# Altium footprint library DrPCB.PcbLib: 910 footprints (part 11 of 57)
Each footprint in its own frame and in the unit in brackets; x right, y up, seen from the top. Pads: shape width x height; smd on the part's side, far side on the other; paste and mask are expansions set on the pad; w line width, h text height; cw(c..) or ccw(c..) is an arc to the next point about the centre after c.
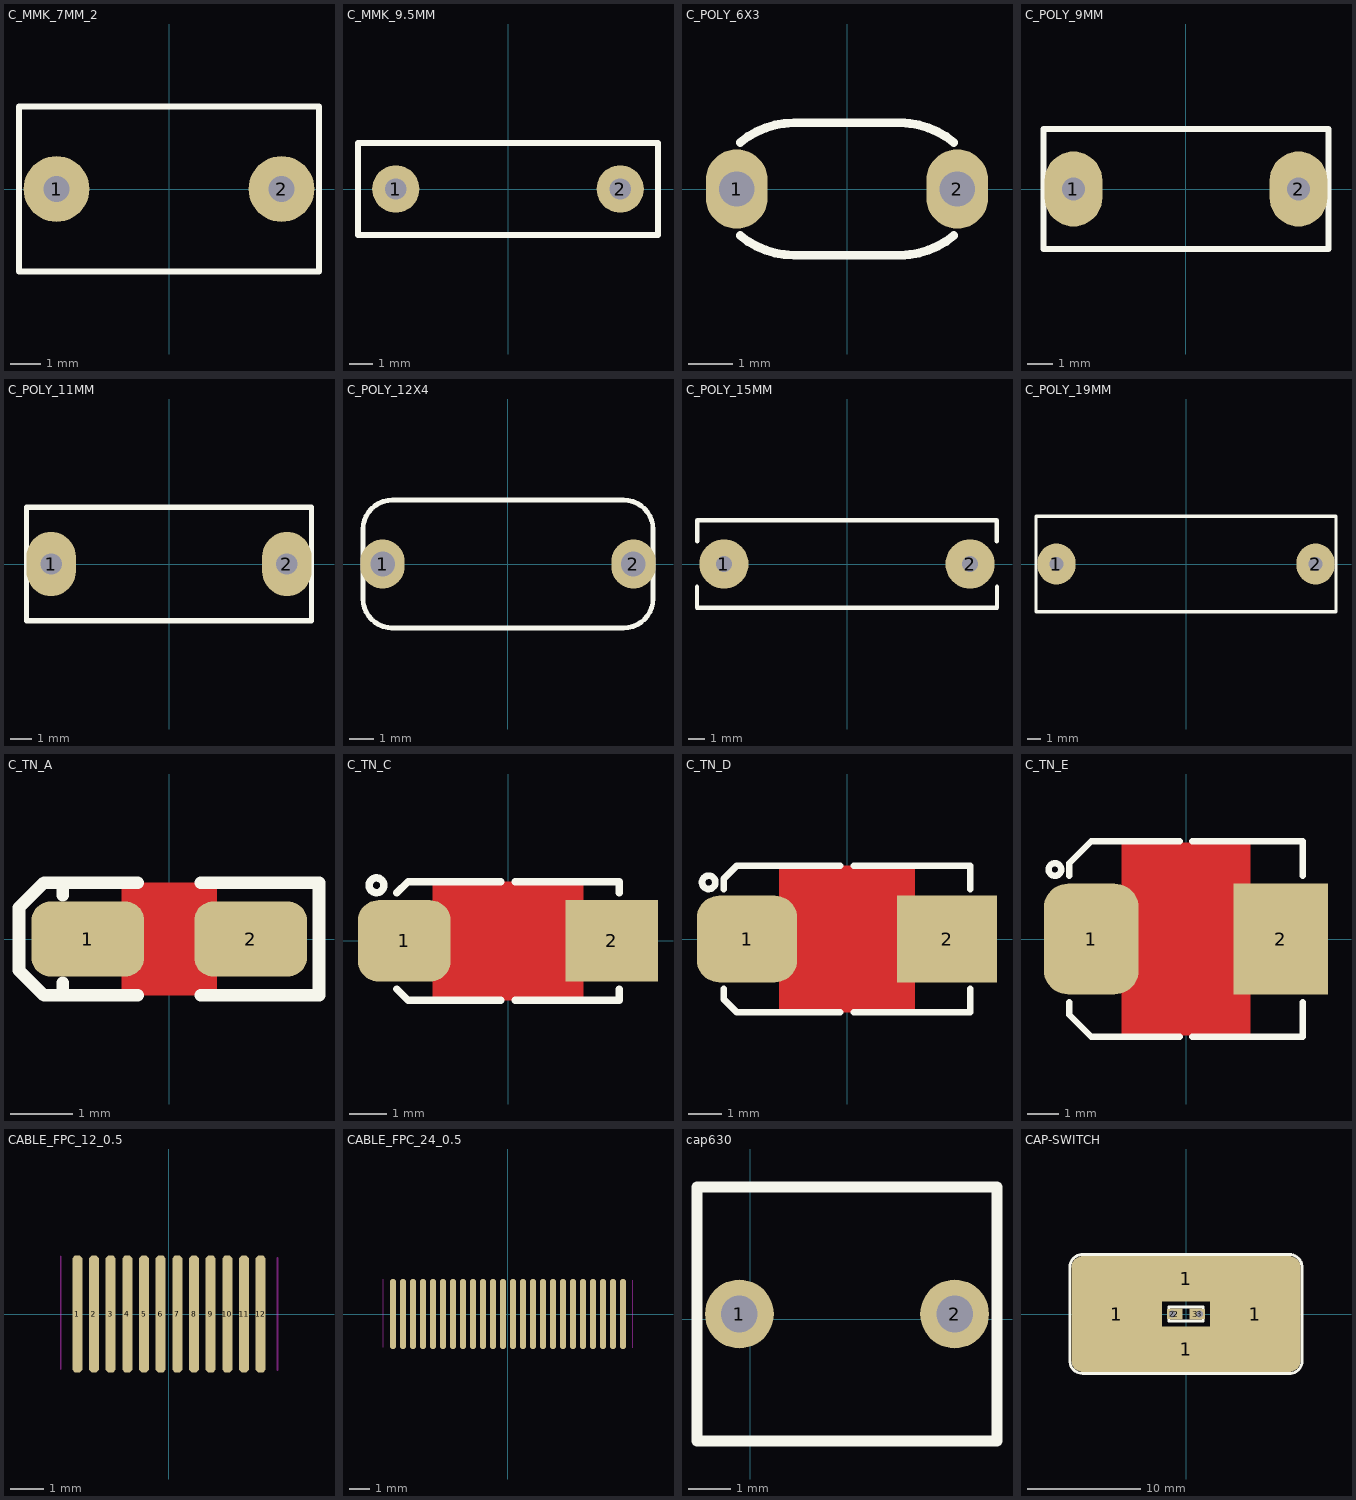
[diagram p10: the footprints below, top view; thin cyan lines are the x and y axes]

## C_MMK_7MM_2 [mm]
pads (2):
  round 2.2 hole 0.85: 1(-3.75,0) 2(3.75,0)
Top Overlay:
  lines w0.2: -5,-2.75 5,-2.75 5,2.75 -5,2.75 -5,-2.75
3D body: height 11.5, standoff 0, extent -5.004,-2.743 4.991,2.718

## C_MMK_9.5MM [mm]
pads (2):
  round 2 hole 0.9: 1(-4.75,0) 2(4.75,0)
Top Overlay:
  lines w0.254: -6.35,-1.95 6.35,-1.95 6.35,1.95 -6.35,1.95 -6.35,-1.95

## C_POLY_6X3 [mm] "CAP, POLYESTER, 5.8X3.5mm pitch: 5.0mm"
pads (2):
  oval 1.4x1.8 hole 0.8: 1(-2.5,0) 2(2.5,0)
Top Overlay:
  lines w0.2: -2.421,-1.055 ccw(c-1.2,0.4) -1.2,-1.5 1.3,-1.5 ; -2.421,1.055 cw(c-1.2,-0.4) -1.2,1.5 1.3,1.5 ; 1.2,-1.5 ccw(c1.2,0.4) 2.421,-1.055 ; 1.2,1.5 cw(c1.2,-0.4) 2.421,1.055
3D body "CAP 6mm Adasi.STEP": height 8.5, standoff -25.12, extent -2.95,-1.9 3.05,1.9

## C_POLY_9MM [mm]
pads (2):
  oval 2.3x3 hole 0.9: 1(-4.5,0) 2(4.5,0)
Top Overlay:
  lines w0.254: -5.7,-2.4 -5.7,2.4 5.7,2.4 5.7,-2.4 -5.7,-2.4

## C_POLY_11MM [mm]
pads (2):
  oval 2.3x3 hole 1: 1(-5.5,0) 2(5.5,0)
Top Overlay:
  lines w0.254: 6.629,-2.65 -6.65,-2.65 -6.65,2.65 6.629,2.65 ; 6.65,-2.65 6.65,2.65
3D body "User Library-Capacitor MKT_B32591C3104 (Pitch 10mm).step": height 12, standoff -6.5, extent -6.51,-2.5 6.49,2.5

## C_POLY_12X4 [mm] "CAP, POLYESTER, 12.5X4.5X9.0 pitch: 10mm"
height 9
pads (2):
  oval 1.8x2 hole 1: 1(-5.1,0) 2(5.1,0)
Top Overlay:
  lines w0.2: -4.734,-2.6 4.702,-2.6 ccw(c4.702,-1.4) 5.902,-1.4 ; -4.7,-2.6 cw(c-4.7,-1.4) -5.9,-1.4 -5.9,1.4 cw(c-4.7,1.4) -4.7,2.6 4.702,2.6 cw(c4.702,1.4) 5.902,1.4 ; 5.9,-1.4 5.9,1.4
3D body "User Library-Capacitor MKT_B32591C3104 (Pitch 10mm).step": height 12.5, standoff -6, extent -6.5,-2.5 6.5,2.5

## C_POLY_15MM [mm]
pads (2):
  round 3 hole 1: 1(-7.5,0) 2(7.5,0)
Top Overlay:
  lines w0.254: -9.144,-1.384 -9.144,-2.667 9.144,-2.667 9.144,-1.384 ; -9.131,1.384 -9.131,2.667 9.131,2.667 9.131,1.384
3D body "User Library-CPLP15mm.step": height 11, standoff -2.6, extent -9,-2.5 9,2.5

## C_POLY_19MM [mm]
pads (2):
  oval 2.8x3 hole 1: 1(-9.5,0) 2(9.5,0)
Top Overlay:
  lines w0.254: -11,-3.5 -11,3.5 11,3.5 11,-3.5 -11,-3.5
3D body: height 14, standoff 0, extent -10.998,-3.505 10.998,3.48

## C_TN_A [mm] "CAPACITOR, TAN A, 1206P, 3.2x1.6mm"
height 1.8
pads (2):
  rrect50% 1.8x1.2 smd mask+0.075: 1(-1.3,0) 2(1.3,0)
Top Layer:
  pour cut-out: -0.762,0.9 0.762,0.9 0.762,-0.9 -0.762,-0.9
Top Overlay:
  lines w0.2: -1.7,-0.7 -1.7,-0.9 ; -1.7,0.7 -1.7,0.9 ; -0.5,-0.9 -1.7,-0.9 ; -0.5,0.9 -1.7,0.9 ; 0.5,-0.9 2.392,-0.9 2.392,0.9 ; 0.5,0.9 2.362,0.9 ; -1.7,-0.9 -2,-0.9 -2.4,-0.5 -2.4,0.5 -2,0.9 -1.7,0.9
3D body "User Library-CAP_TANT_3216-18_A_case-1.step": height 1.7, standoff 0, extent -1.7,-0.9 1.7,0.9

## C_TN_C [mm] "CAPACITOR, TAN C, TAN F, TAN U, TAN L, 6032P, 6.0X3.2mm"
height 2.8
pads (2):
  rrect50% 2.5x2.2 smd: 1(-2.8,0)
  rect 2.5x2.2 smd: 2(2.8,0)
Top Layer:
  pour cut-out: -2.032,1.6 2.032,1.6 2.032,-1.6 -2.032,-1.6
Top Overlay:
  circle w0.2: c-3.55,1.5 r0.2
  lines w0.2: -3,-1.3 -2.7,-1.6 -0.2,-1.6 ; -3,1.3 -2.7,1.6 -0.2,1.6 ; 0.2,-1.6 3,-1.6 3,-1.3 ; 0.2,1.6 3,1.6 3,1.3
3D body "User Library-CAP_TANT_6032-28_y.step": height 2.8, standoff 0, extent -3.15,-1.75 3.15,1.75

## C_TN_D [mm] "CAPACITOR, TAN D, TAN E, TAN Y, TAN X, 7343P, 7.3X4.3mm"
height 4.3
pads (2):
  rrect50% 3x2.6 smd: 1(-3,0)
  rect 3x2.6 smd: 2(3,0)
Top Layer:
  pour cut-out: -2.032,2.2 -2.032,-2.2 2.032,-2.2 2.032,2.2
Top Overlay:
  circle w0.2: c-4.15,1.7 r0.2
  lines w0.2: -3.7,-1.5 -3.7,-1.8 -3.3,-2.2 -0.2,-2.2 ; -3.7,1.5 -3.7,1.8 -3.3,2.2 -0.2,2.2 ; 0.2,-2.2 3.7,-2.2 3.7,-1.5 ; 0.2,2.2 3.7,2.2 3.7,1.5
3D body "User Library-AVX_E_CASE.step": height 4.2, standoff 0, extent -3.7,-2.225 3.701,2.225

## C_TN_E [mm] "CAPACITOR, TAN V, 2924, 7361, 7.3X6.1mm"
pads (2):
  rrect50% 3x3.5 smd: 1(-3,0)
  rect 3x3.5 smd: 2(3,0)
Top Layer:
  pour cut-out: -2.032,3.048 -2.032,-3.048 2.032,-3.048 2.032,3.048
Top Overlay:
  circle w0.2: c-4.15,2.2 r0.2
  lines w0.2: -3.7,-2 -3.7,-2.4 -3,-3.1 -0.2,-3.1 ; -3.7,2 -3.7,2.4 -3,3.1 -0.2,3.1 ; 0.2,-3.1 3.7,-3.1 3.7,-2 ; 0.2,3.1 3.7,3.1 3.7,2
3D body "User Library-CT_V.step": height 3.45, standoff 0, extent -3.65,-3.05 3.65,3.05

## CABLE_FPC_12_0.5 [mm]
pads (12):
  oct 0.3x3.5 smd: 1(-2.75,0) 2(-2.25,0) 3(-1.75,0) 4(-1.25,0) 5(-0.75,0) 6(-0.25,0) 7(0.25,0) 8(0.75,0) 9(1.25,0) 10(1.75,0) 11(2.25,0) 12(2.75,0)
Keep-Out Layer:
  lines w0.05: -3.248,-1.651 -3.248,1.727 ; 3.256,-1.689 3.256,1.689

## CABLE_FPC_24_0.5 [mm]
pads (24):
  oct 0.3x3.5 smd: 1(-5.75,0) 2(-5.25,0) 3(-4.75,0) 4(-4.25,0) 5(-3.75,0) 6(-3.25,0) 7(-2.75,0) 8(-2.25,0) 9(-1.75,0) 10(-1.25,0) 11(-0.75,0) 12(-0.25,0) 13(0.25,0) 14(0.75,0) 15(1.25,0) 16(1.75,0) 17(2.25,0) 18(2.75,0) 19(3.25,0) 20(3.75,0) 21(4.25,0) 22(4.75,0) 23(5.25,0) 24(5.75,0)
Keep-Out Layer:
  lines w0.05: -6.248,-1.651 -6.248,1.727 ; 6.25,-1.689 6.25,1.689

## cap630 [mil]
pads (2):
  round 63.94 hole 33.94: 1(-10,5) 2(190,5)
Top Overlay:
  lines w10: -49.37,-113.11 229.37,-113.11 229.37,123.11 -49.37,123.11 -49.37,-113.11

## CAP-SWITCH [mm]
pads (8):
  rrect50% 8x10 smd: 1(-6.121,0) 1(6.121,0)
  rrect50% 20.24x4 smd: 1(0,-3.124) 1(0,3.124)
  rect 0.9x0.9 hole 0.6: 2(-1.206,0) 3(1.206,0)
  rect 1.1x1 smd: 2(-0.85,0) 3(0.85,0)
Top Overlay:
  lines w0.254: -10.262,-4.229 -10.262,4.127 ; -10.251,-4.249 ccw(c-9.157,-4.147) -9.144,-5.245 ; -10.249,4.14 cw(c-9.151,4.153) -9.253,5.247 ; -9.271,5.245 9.157,5.245 ; -9.08,-5.245 9.246,-5.245 ; -1.524,0.572 -1.524,-0.622 1.524,-0.622 1.524,0.61 ; -1.524,0.622 1.524,0.622 ; 9.129,5.25 cw(c9.143,4.152) 10.236,4.254 ; 9.253,-5.247 ccw(c9.151,-4.153) 10.249,-4.14 ; 10.249,-4.127 10.249,4.229